# Altium footprint library DataDriven_PCB2.PcbLib: 59 footprints (part 1 of 4)
Each footprint in its own frame and in the unit in brackets; x right, y up, seen from the top. Pads: shape width x height; smd on the part's side, far side on the other; paste and mask are expansions set on the pad; w line width, h text height; cw(c..) or ccw(c..) is an arc to the next point about the centre after c.
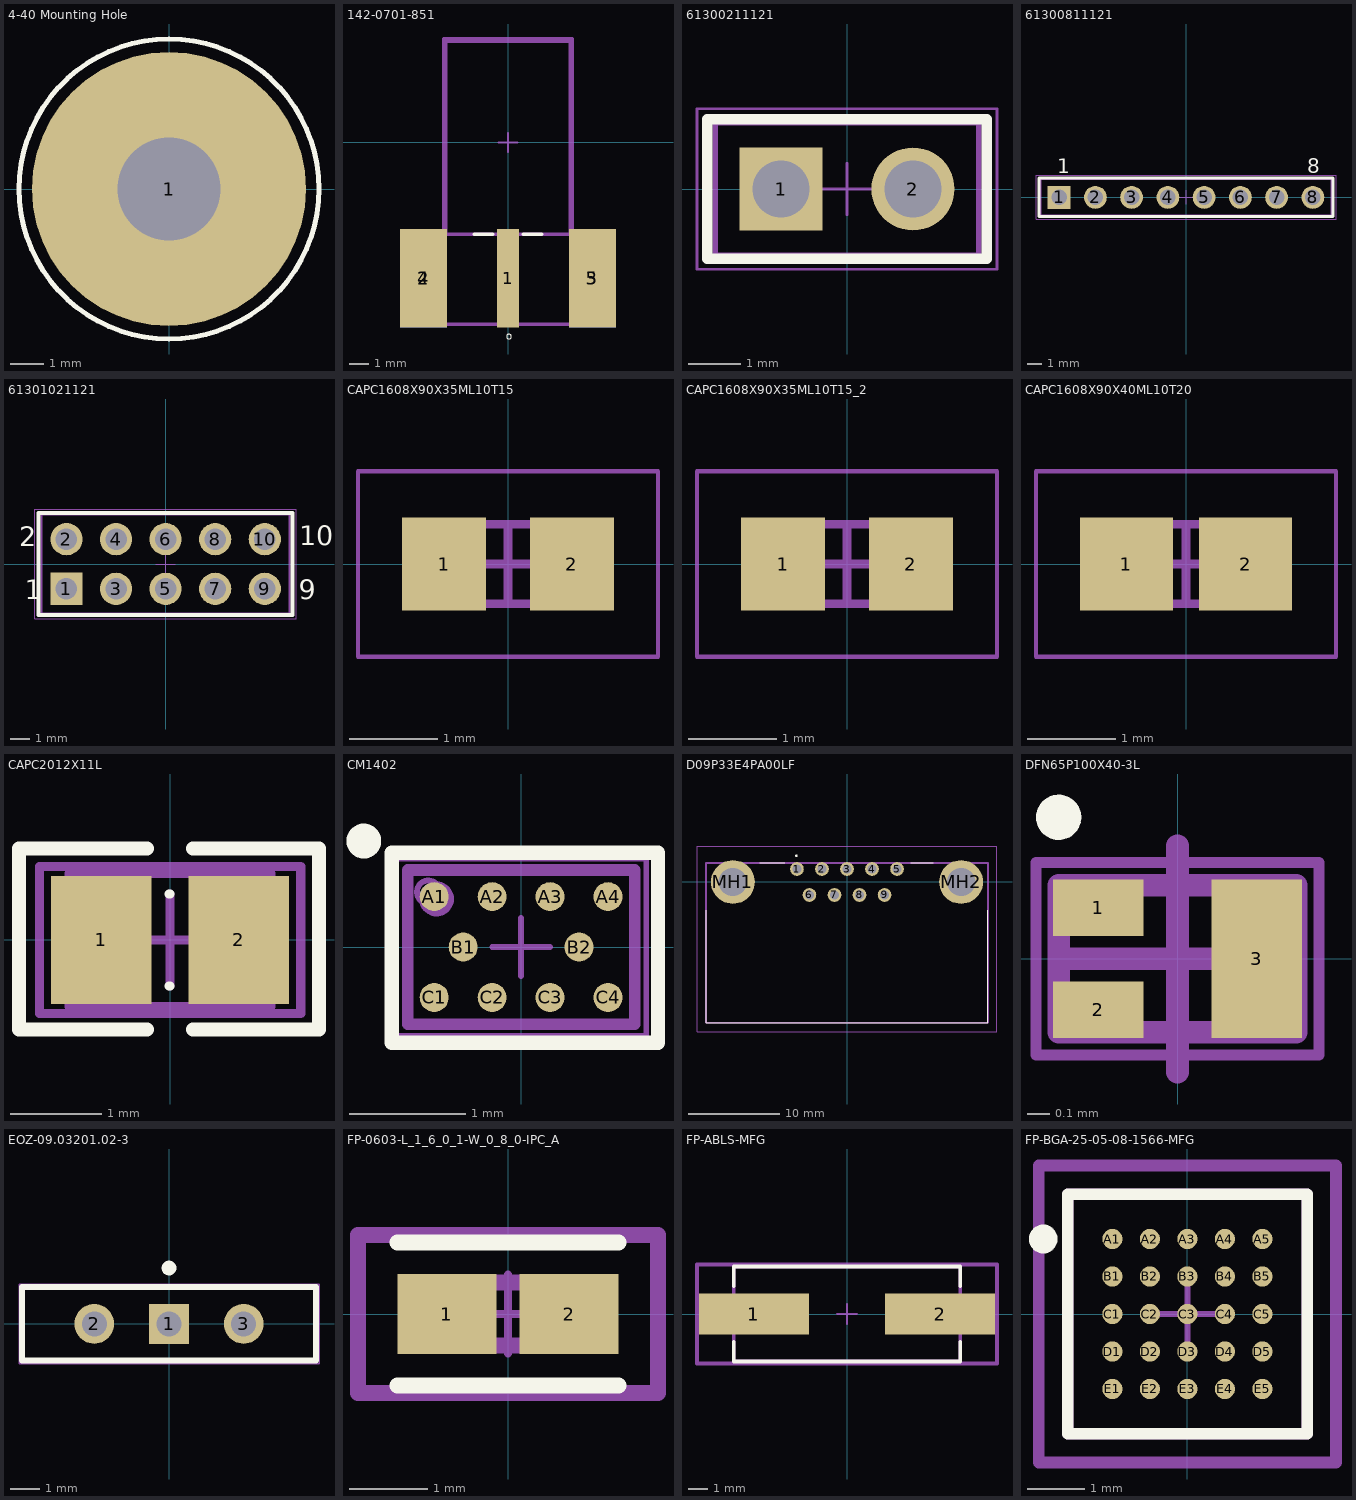
[diagram p0: the footprints below, top view; thin cyan lines are the x and y axes]

## 4-40 Mounting Hole [mil] "4-40 Mounting Hole"
height 35.43
pads (1):
  round 320 hole 120 paste-196.85: 1(0,0)
Top Overlay:
  circle w5.91: c0,0 r175
Top Assembly:
  text ".Designator" at -102.74,200.39 h35
Mechanical 7:
  circle w3.94: c0,0 r175
  circle w3.94: c0,0 r29.53
  text ".Designator" at -11.81,51.18 h15
3D body: height 2, standoff 0, extent -29.52,-29.53 29.53,29.53

## 142-0701-851 [mil] "SMA Connector Jack, Female Socket 50Ohm Board Edge, End Launch Solder Tab"
height 35.43
pads (5):
  rect 45x200 smd paste-30: 1(0,-276.77)
  rect 95x200 smd paste-50: 2(-172,-276.77) 3(172,-276.77)
  rect 95x200 smd far side paste-50: 4(-172,-276.77) 5(172,-276.77)
Top Overlay:
  circle w0: c1.97,-395.47 r4.92
  lines w7.87: -68.7,-187.01 -31.5,-187.01 ; 31.5,-187.01 68.7,-187.01
Top 3D Body:
  lines w7.87: -126.97,-187.01 -126.97,206.69 126.97,206.69 126.97,-187.01 -126.97,-187.01
Top Courtyard:
  lines w7.87: -130.91,-370.47 -130.91,210.63 130.91,210.63 130.91,-370.47 -130.91,-370.47
Top Assembly:
  lines w7.87: -130.91,-370.47 -130.91,210.63 130.91,210.63 130.91,-370.47 -130.91,-370.47
  text ".Designator" at 0,-79.94 h39.37
Top Component Center:
  lines w3.94: -19.68,0 19.68,0 ; 0,-19.68 0,19.68
3D body "142-0701-851.stp": height 156, standoff -156, extent -186.34,-365.27 188.66,196.73

## 61300211121 [mm] "Pin Header, pitch 2.54 mm, THT, Vertical, single row, 2p"
height 8.54
pads (2):
  rect 1.6x1.6 hole 1.1: 1(-1.27,0)
  round 1.6 hole 1.1: 2(1.27,0)
Top Overlay:
  lines w0.203: -2.69,-1.345 -2.69,1.345 2.69,1.345 2.69,-1.345 -2.69,-1.345
Mechanical 13:
  lines w0.1: -2.54,-1.27 2.54,-1.27 2.54,1.27 -2.54,1.27 -2.54,-1.27
Mechanical 15:
  lines w0.05: -0.5,0 0.5,0 ; 0,-0.5 0,0.5 ; -2.89,-1.545 2.89,-1.545 2.89,1.545 -2.89,1.545 -2.89,-1.545
3D body "61300211121.stp": height 8.57, standoff -2.97, extent -2.54,-1.27 2.54,1.27

## 61300811121 [mm] "Pin Header, pitch 2.54 mm, THT, Vertical, single row, 8p"
height 8.54
pads (8):
  rect 1.6x1.6 hole 1.1: 1(-8.89,0)
  round 1.6 hole 1.1: 2(-6.35,0) 3(-3.81,0) 4(-1.27,0) 5(1.27,0) 6(3.81,0) 7(6.35,0) 8(8.89,0)
Top Overlay:
  lines w0.203: -10.31,-1.345 10.31,-1.345 10.31,1.345 -10.31,1.345 -10.31,-1.345
  text "1" at -9.01,1.7 h1.02
  text "8" at 8.51,1.7 h1.02
Mechanical 13:
  lines w0.1: -10.16,-1.27 -10.16,1.27 10.16,1.27 10.16,-1.27 -10.16,-1.27
Mechanical 15:
  lines w0.05: -0.5,0 0.5,0 ; 0,-0.5 0,0.5 ; -10.51,-1.545 -10.51,1.545 10.51,1.545 10.51,-1.545 -10.51,-1.545
3D body "61300811121.stp": height 8.57, standoff -2.97, extent -10.16,-1.27 10.16,1.27

## 61301021121 [mm] "Pin Header, pitch 2.54 mm, THT, Vertical, dual row, 10p"
height 8.54
pads (10):
  rect 1.65x1.65 hole 1.1: 1(-5.08,-1.27)
  round 1.65 hole 1.1: 2(-5.08,1.27) 3(-2.54,-1.27) 4(-2.54,1.27) 5(0,-1.27) 6(0,1.27) 7(2.54,-1.27) 8(2.54,1.27) 9(5.08,-1.27) 10(5.08,1.27)
Top Overlay:
  lines w0.203: -6.5,-2.615 -6.5,2.615 6.5,2.615 6.5,-2.615 -6.5,-2.615
  text "10" at 6.84,0.97 h1.02
  text "9" at 6.81,-1.8 h1.02
  text "1" at -7.21,-1.8 h1.02
  text "2" at -7.51,0.9 h1.02
Mechanical 13:
  lines w0.1: -6.35,-2.54 -6.35,2.54 6.35,2.54 6.35,-2.54 -6.35,-2.54
Mechanical 15:
  lines w0.05: -0.5,0 0.5,0 ; 0,-0.5 0,0.5 ; -6.7,-2.815 6.7,-2.815 6.7,2.815 -6.7,2.815 -6.7,-2.815
3D body "61301021121.stp": height 8.59, standoff -2.95, extent -6.35,-2.54 6.35,2.54

## CAPC1608X90X35ML10T15 [mm] "Chip Capacitor, 2-Leads, Body 1.60x0.80mm, IPC Low Density"
height 0.9
pads (2):
  rect 0.95x1.05 smd: 1(-0.725,0) 2(0.725,0)
Mechanical 13:
  lines w0.1: -0.85,-0.45 0.85,-0.45 0.85,0.45 -0.85,0.45 -0.85,-0.45
Mechanical 15:
  lines w0.05: -1.7,-1.05 1.7,-1.05 1.7,1.05 -1.7,1.05 -1.7,-1.05
  lines w0.1: -0.45,0 0.45,0 ; 0,-0.45 0,0.45
3D body: height 0.9, standoff 0, extent 0.5,-0.45 0.85,0.45
3D body: height 0.9, standoff 0, extent -0.85,-0.45 -0.5,0.45
3D body: height 0.9, standoff 0, extent -0.5,-0.45 0.5,0.45

## CAPC1608X90X35ML10T15_2 [mm]
pads (2):
  rect 0.95x1.05 smd: 1(-0.725,0) 2(0.725,0)
Mechanical 13:
  lines w0.1: -0.85,-0.45 0.85,-0.45 0.85,0.45 -0.85,0.45 -0.85,-0.45
Mechanical 15:
  lines w0.05: -1.7,-1.05 1.7,-1.05 1.7,1.05 -1.7,1.05 -1.7,-1.05
  lines w0.1: -0.45,0 0.45,0 ; 0,-0.45 0,0.45
3D body "CAPC1608X09M.step": height 0.9, standoff 0, extent -0.85,-0.45 0.85,0.45

## CAPC1608X90X40ML10T20 [mm] "Chip Capacitor, 2-Leads, Body 1.7x0.9mm, IPC Low Density"
height 0.9
pads (2):
  rect 1.05x1.05 smd: 1(-0.675,0) 2(0.675,0)
Mechanical 13:
  lines w0.1: -0.85,-0.45 0.85,-0.45 0.85,0.45 -0.85,0.45 -0.85,-0.45
Mechanical 15:
  lines w0.05: -1.7,-1.05 1.7,-1.05 1.7,1.05 -1.7,1.05 -1.7,-1.05
  lines w0.1: -0.45,0 0.45,0 ; 0,-0.45 0,0.45
3D body "CAPC1608X09M.step": height 0.9, standoff 0, extent -0.85,-0.45 0.85,0.45

## CAPC2012X11L [mm]
pads (2):
  rect 1.1x1.4 smd: 1(-0.75,0) 2(0.75,0)
Top Overlay:
  lines w0.1: -0.01,-0.5 0,-0.5 ; -0.01,0.5 0,0.5
  lines w0.152: -0.25,-0.978 -1.647,-0.978 -1.647,1 -0.25,1 ; 0.25,-0.978 1.625,-0.978 1.625,1 0.25,1
Mechanical 7:
  lines w0.1: -1.1,-0.725 -1.1,0.725 1.1,0.725 1.1,-0.725 -1.1,-0.725
  text ".Designator" at -0.711,-0.152 h0.3
Mechanical 15:
  lines w0.1: -0.5,0 0.5,0 ; 0,-0.5 0,0.5 ; -1.425,-0.8 -1.425,0.8 1.425,0.8 1.425,-0.8 -1.425,-0.8
3D body "SW3dPS-0805 SMD Capacitor.STEP": height 0.77, standoff -0.01, extent -1,-0.625 1,0.625

## CM1402 [mm]
pads (10):
  round 0.25 smd mask+0.05: A1(-0.75,0.435) A2(-0.25,0.435) A3(0.25,0.435) A4(0.75,0.435) B1(-0.5,0) B2(0.5,0) C1(-0.75,-0.435) C2(-0.25,-0.435) C3(0.25,-0.435) C4(0.75,-0.435)
Top Overlay:
  circle w0.2: c-1.358,0.915 r0.05
  lines w0.125: -1.118,-0.826 1.181,-0.826 1.181,0.813 -1.118,0.813 -1.118,-0.826
Mechanical 7:
  circle w0.2: c-0.73,0.415 r0.05
  lines w0.1: -0.98,-0.665 0.98,-0.665 0.98,0.665 -0.98,0.665 -0.98,-0.665
  text ".Designator" at -0.533,-0.127 h0.3
Mechanical 15:
  circle w0.05: c-0.8,0.475 r0.1
  lines w0.05: -0.25,0 0.25,0 ; 0,-0.25 0,0.25 ; -1.08,-0.765 -1.08,0.765 1.08,0.765 1.08,-0.765 -1.08,-0.765
3D body: height 0.72, standoff 0.21, extent -0.98,-0.665 0.98,0.665

## D09P33E4PA00LF [mm] "D-Sub Standard Connectors 9P RA PIN SOLDER SHELL SIZE E"
pads (11):
  round 1.5 hole 1: 1(-5.48,1.42) 2(-2.74,1.42) 3(0,1.42) 4(2.74,1.42) 5(5.48,1.42) 6(-4.11,-1.42) 7(-1.37,-1.42) 8(1.37,-1.42) 9(4.11,-1.42)
  round 4.8 hole 3.1: MH1(-12.495,0) MH2(12.495,0)
Top Overlay:
  lines w0.1: -15.42,-15.4 -15.42,-3.08 -15.42,-15.4 ; -15.42,-15.4 15.42,-15.4 ; -15.42,-15.4 15.42,-15.4 ; 15.42,-15.4 15.42,-3.08 15.42,-15.4 ; -9.545,2.08 -6.795,2.08 -9.545,2.08 ; 6.955,2.08 9.455,2.08 6.955,2.08
  lines w0.2: -5.545,2.82 ccw(c-5.545,2.87) -5.545,2.92 ; -5.545,2.82 cw(c-5.545,2.87) -5.545,2.92 ; -5.545,2.82 ccw(c-5.545,2.87) -5.545,2.92
Mechanical 13:
  lines w0.2: -15.42,-15.4 -15.42,2.08 15.42,2.08 15.42,-15.4 -15.42,-15.4
Mechanical 15:
  lines w0.1: -16.42,-16.4 -16.42,3.92 16.42,3.92 16.42,-16.4 -16.42,-16.4
3D body "sD09P33E4PA00LF.stp": height 12.55, standoff -3.18, extent -15.405,-15.679 15.405,2.921

## DFN65P100X40-3L [mm]
pads (3):
  rect 0.4x0.25 smd mask+0.065: 1(-0.35,0.225) 2(-0.35,-0.225)
  rect 0.4x0.7 smd mask+0.065: 3(0.35,0)
Top Overlay:
  circle w0.1: c-0.525,0.625 r0.05
Mechanical 7:
  lines w0.1: -0.525,-0.325 -0.525,0.325 0.525,0.325 0.525,-0.325 -0.525,-0.325
  text ".Designator" at -0.425,-0.175 h0.38
Mechanical 15:
  lines w0.05: -0.625,-0.425 -0.625,0.425 0.625,0.425 0.625,-0.425 -0.625,-0.425
  lines w0.1: -0.5,0 0.5,0 ; 0,-0.5 0,0.5
3D body "DFN65P100X40-3L.step": height 0.4, standoff 0, extent -0.525,-0.325 0.525,0.325

## EOZ-09.03201.02-3 [mm] "TH, 3-Leads, Body 10x2.5mm, Pitch 2.54mm"
height 6.4
pads (3):
  rect 1.35x1.35 hole 0.85: 1(0,0)
  round 1.35 hole 0.85: 2(-2.54,0) 3(2.54,0)
Top Overlay:
  circle w0.25: c0,1.9 r0.125
  lines w0.203: -5,-1.25 -5,1.25 5,1.25 5,-1.25 -5,-1.25
Mechanical 13:
  lines w0.1: -5,-1.25 -5,1.25 5,1.25 5,-1.25 -5,-1.25
Mechanical 15:
  lines w0.05: -5.1,-1.35 5.1,-1.35 5.1,1.35 -5.1,1.35 -5.1,-1.35
3D body: height 6.4, standoff 0, extent -5,-1.25 5,1.25

## FP-0603-L_1_6_0_1-W_0_8_0-IPC_A [mm]
pads (2):
  rect 1.258x1.012 smd paste+0 mask+0: 1(-0.777,0) 2(0.777,0)
Top Overlay:
  lines w0.203: -1.406,-0.906 1.406,-0.906 ; -1.406,0.906 1.406,0.906
Top 3D Body:
  lines w0.203: -0.8,-0.4 -0.8,0.4 0.8,0.4 0.8,-0.4 -0.8,-0.4
Top Courtyard:
  lines w0.203: -1.906,-1.006 -1.906,1.006 1.906,1.006 1.906,-1.006 -1.906,-1.006
Top Assembly:
  lines w0.203: -1.906,-1.006 -1.906,1.006 1.906,1.006 1.906,-1.006 -1.906,-1.006
  text ".Designator" at 0.1,0.433 h1
Top Component Center:
  lines w0.1: -0.5,0 0.5,0 ; 0,-0.5 0,0.5
3D body "Cap_Taiyo_Yuden_LMK107SD223KA-T_eec.STEP": height 0.25, standoff 0, extent -1.906,-1.006 1.906,1.006

## FP-ABLS-MFG [mm]
pads (2):
  rect 5.6x2.1 smd paste+0 mask+0: 1(-4.75,0) 2(4.75,0)
Top Overlay:
  lines w0.2: -5.775,-1.425 -5.775,-2.425 5.775,-2.425 5.775,-1.425 ; -5.775,1.425 -5.775,2.425 5.775,2.425 5.775,1.425
Top 3D Body:
  lines w0.2: -5.775,-2.425 5.775,-2.425 5.775,2.425 -5.775,2.425 -5.775,-2.425
Top Courtyard:
  lines w0.2: -7.65,-2.525 7.65,-2.525 7.65,2.525 -7.65,2.525 -7.65,-2.525
Top Assembly:
  lines w0.2: -7.65,-2.525 7.65,-2.525 7.65,2.525 -7.65,2.525 -7.65,-2.525
  text ".Designator" at 0,0.188 h1
Top Component Center:
  lines w0.1: -0.5,0 0.5,0 ; 0,-0.5 0,0.5
3D body "Crys_Abracon_ABLS-16_000MHZ-K4T_eec.STEP": height 0.25, standoff 0, extent -7.65,-2.525 7.65,2.525

## FP-BGA-25-05-08-1566-MFG [mm]
pads (25):
  round 0.35 smd paste+0 mask+0: A1(-1.3,1.3) A2(-0.65,1.3) A3(0,1.3) A4(0.65,1.3) A5(1.3,1.3) B1(-1.3,0.65) B2(-0.65,0.65) B3(0,0.65) B4(0.65,0.65) B5(1.3,0.65) C1(-1.3,0) C2(-0.65,0) C3(0,0) C4(0.65,0) C5(1.3,0) D1(-1.3,-0.65) D2(-0.65,-0.65) D3(0,-0.65) D4(0.65,-0.65) D5(1.3,-0.65) E1(-1.3,-1.3) E2(-0.65,-1.3) E3(0,-1.3) E4(0.65,-1.3) E5(1.3,-1.3)
Top Overlay:
  circle w0.25: c-2.5,1.3 r0.125
  lines w0.203: -2.075,-2.075 -2.075,2.075 2.075,2.075 2.075,-2.075 -2.075,-2.075
Top 3D Body:
  lines w0.203: -2.075,-2.075 -2.075,2.075 2.075,2.075 2.075,-2.075 -2.075,-2.075
Top Courtyard:
  lines w0.203: -2.575,-2.575 -2.575,2.575 2.575,2.575 2.575,-2.575 -2.575,-2.575
Top Assembly:
  lines w0.203: -2.575,-2.575 -2.575,2.575 2.575,2.575 2.575,-2.575 -2.575,-2.575
  text ".Designator" at 0.1,0.433 h1
Top Component Center:
  lines w0.1: -0.5,0 0.5,0 ; 0,-0.5 0,0.5
3D body "IC_Analog_Devices_LTM8074IY_eec.STEP": height 0.25, standoff 0, extent -2.575,-2.575 2.575,2.575